# Altium footprint library Selex_PCBLib.PcbLib: 388 footprints (part 10 of 25)
Each footprint in its own frame and in the unit in brackets; x right, y up, seen from the top. Pads: shape width x height; smd on the part's side, far side on the other; paste and mask are expansions set on the pad; w line width, h text height; cw(c..) or ccw(c..) is an arc to the next point about the centre after c.
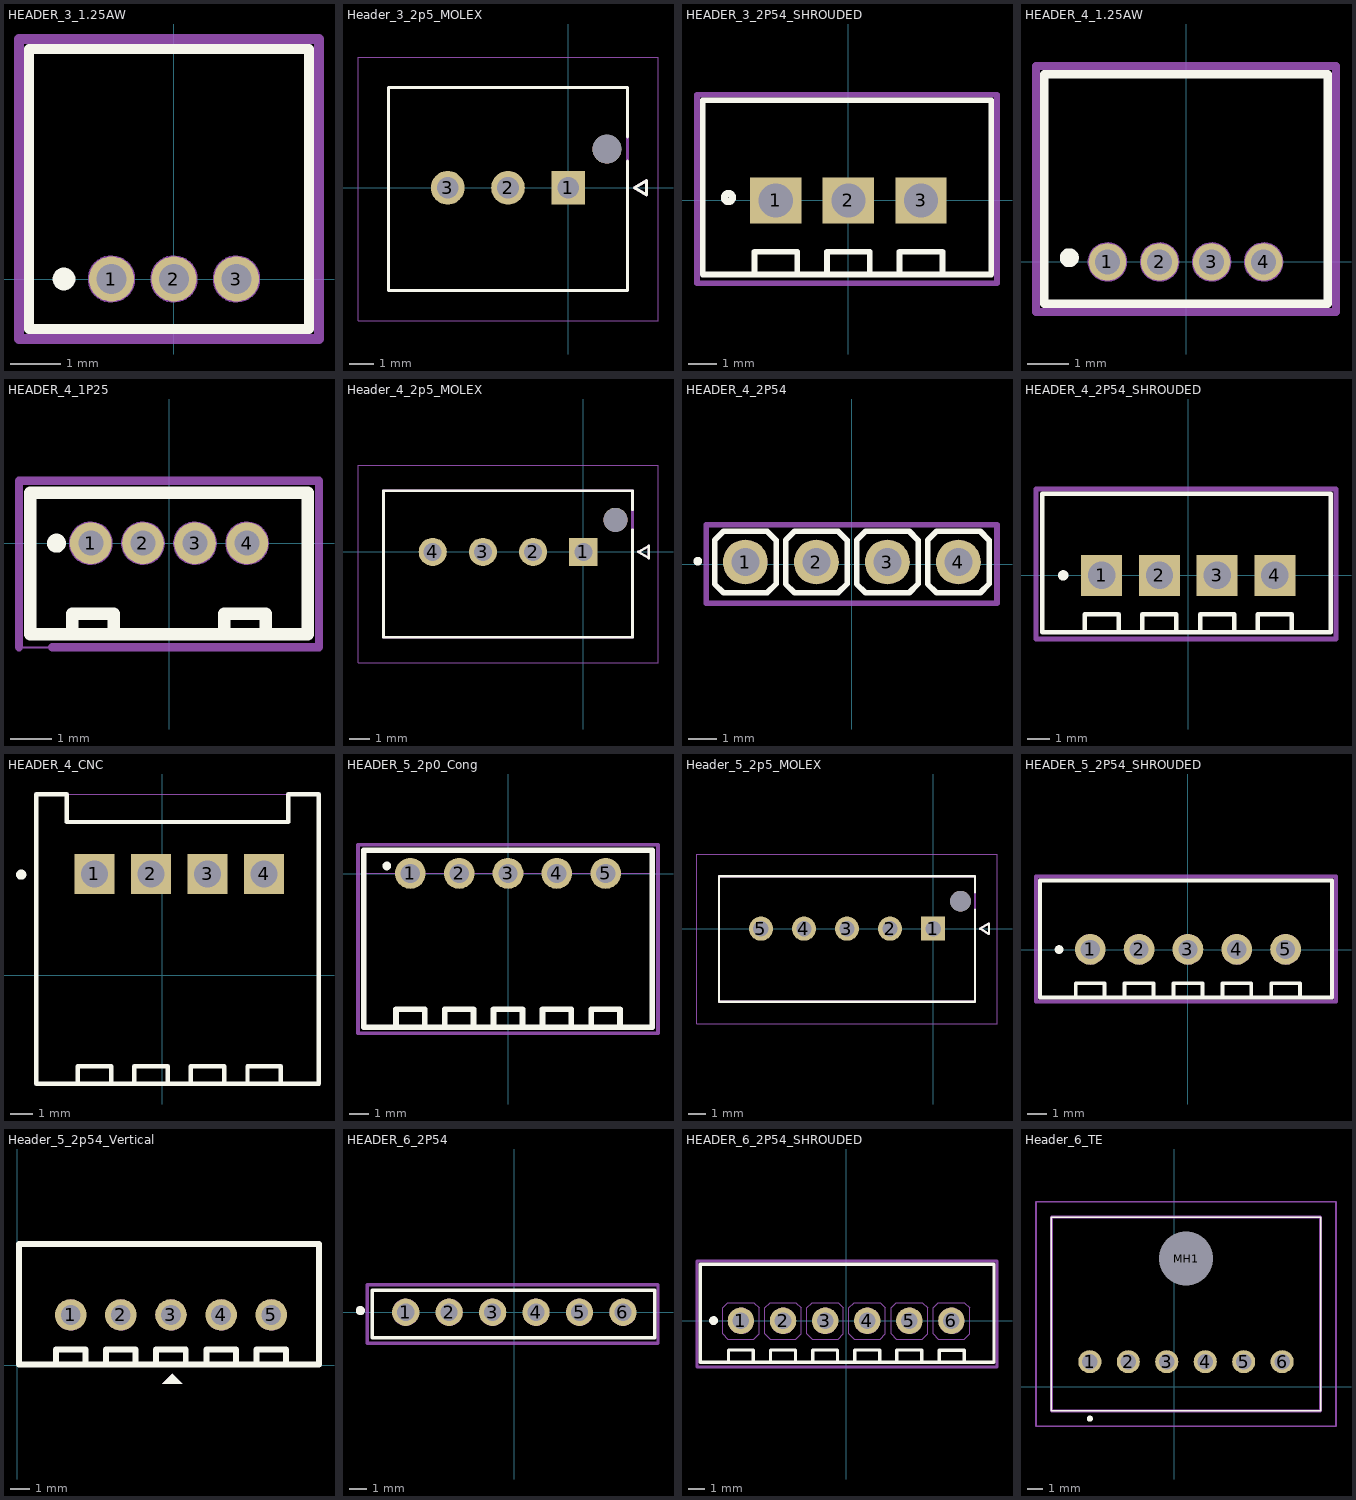
[diagram p9: the footprints below, top view; thin cyan lines are the x and y axes]

## HEADER_3_1.25AW [mm]
pads (3):
  round 0.9 hole 0.6 mask+0.05: 1(-1.25,0) 2(0,0) 3(1.25,0)
Top Overlay:
  circle w0.254: c-2.2,0 r0.1
  lines w0.2: -2.9,-1 -2.9,4.6 2.7,4.6 2.7,-1 -2.9,-1
Mechanical 1:
  circle w0.05: c-1.25,0 r0.45
  circle w0.05: c0,0 r0.45
  circle w0.05: c1.25,0 r0.45
  lines w0.05: -2.85,-1 2.7,-1 2.7,4.6 -2.85,4.6 -2.85,-1
Mechanical 15:
  lines w0.2: -3.1,-1.2 -3.1,4.8 2.9,4.8 2.9,-1.2 -3.1,-1.2
3D body "47566.stp": height 3.68, standoff -2.22, extent -2.8,-0.9 2.6,4.5

## Header_3_2p5_MOLEX [mm]
pads (4):
  rect 1.4x1.4 hole 0.9 mask+0.076: 1(0,0)
  round 1.4 hole 0.9 mask+0.076: 2(-2.5,0) 3(-5,0)
  round 1.2 hole 1.2 unplated mask+0.076: ""(1.6,1.6)
Top Overlay:
  lines w0.127: 2.45,1.1 2.45,-4.25 -7.45,-4.25 -7.45,4.15 2.45,4.15 2.45,2.1 ; 2.75,0 3.25,-0.3 3.25,0.3 2.75,0
Bottom Solder:
  circle w0.776: c-2.5,0 r0.388
  circle w0.676: c1.6,1.6 r0.338
  circle w0.776: c-5,0 r0.388
  region: 0.776,-0.776 -0.776,-0.776 -0.776,0.776 0.776,0.776
Mechanical 13:
  lines w0.127: -7.45,-4.25 2.45,-4.25 2.45,4.15 -7.45,4.15 -7.45,-4.25 ; 2.75,0 3.25,-0.3 3.25,0.3 2.75,0
Mechanical 15:
  lines w0.05: -8.72,-5.52 3.72,-5.52 3.72,5.42 -8.72,5.42 -8.72,-5.52
3D body "2078430003--3DModel-STEP-361473.STEP": height 9, standoff -3, extent -7.45,-4.2 2.47,4.2

## HEADER_3_2P54_SHROUDED [mm] "HEADER_3_2P0"
pads (3):
  rect 1.8x1.6 hole 1.2 mask+0.1: 1(-2.54,0) 2(0,0) 3(2.54,0)
Top Overlay:
  circle w0.254: c-4.2,0.1 r0.141
  lines w0.2: -3.29,-2.5 -3.29,-1.8 -1.79,-1.8 -1.79,-2.5 ; -0.75,-2.5 -0.75,-1.8 0.75,-1.8 0.75,-2.5 ; 1.79,-2.5 1.79,-1.8 3.29,-1.8 3.29,-2.5 ; -5.1,-2.596 5,-2.596 5,3.504 -5.1,3.504 -5.1,-2.596
Mechanical 1:
  circle w0.05: c2.54,0 r0.762
  circle w0.05: c0,0 r0.762
  circle w0.05: c-2.54,0 r0.762
  lines w0.05: -3.29,-2.596 -3.29,-1.8 -1.79,-1.8 -1.79,-2.596 ; -0.75,-2.596 -0.75,-1.8 0.75,-1.8 0.75,-2.596 ; 1.79,-2.59 1.79,-1.8 3.29,-1.8 3.29,-2.596 ; -5.18,-2.596 -5.18,3.504 5.1,3.504 5.1,-2.596 -5.18,-2.596
  text "1" at -2.7,-0.4 h0.8
  text "2" at -0.3,-0.4 h0.8
  text "3" at 2.3,-0.4 h0.8
Mechanical 15:
  lines w0.2: -5.3,-2.9 -5.3,3.7 5.2,3.7 5.2,-2.9 2.4,-2.9 -5.3,-2.9
3D body "JST3.step": height 7, standoff -3.4, extent -4.99,-2.375 4.91,3.375

## HEADER_4_1.25AW [mm]
pads (4):
  round 0.9 hole 0.6 mask+0.05: 1(-1.885,0) 2(-0.635,0) 3(0.615,0) 4(1.865,0)
Top Overlay:
  circle w0.254: c-2.8,0.1 r0.1
  lines w0.2: -3.4,-1 3.4,-1 3.4,4.5 -3.4,4.5 -3.4,-1
Mechanical 1:
  circle w0.05: c0.615,0 r0.45
  circle w0.05: c-0.635,0 r0.45
  circle w0.05: c-1.885,0 r0.45
  circle w0.05: c1.865,0 r0.45
  lines w0.05: -3.4,-1 3.4,-1 3.4,4.5 -3.4,4.5 -3.4,-1
Mechanical 15:
  lines w0.2: -3.6,-1.2 -3.6,4.7 3.6,4.7 3.6,-1.2 -3.6,-1.2
3D body "31731.stp": height 3.68, standoff -2.22, extent -3.31,-1 3.34,4.4

## HEADER_4_1P25 [mm]
pads (4):
  round 1 hole 0.6 mask+0.05: 1(-1.875,0) 2(-0.625,0) 3(0.625,0) 4(1.875,0)
Top Overlay:
  circle w0.254: c-2.7,0 r0.1
  lines w0.3: -2.325,-2.19 -2.325,-1.69 -1.325,-1.69 -1.325,-2.19 ; 1.325,-2.19 1.325,-1.69 2.325,-1.69 2.325,-2.19 ; -3.325,-2.19 3.325,-2.19 3.325,1.21 -3.325,1.21 -3.325,-2.19
Mechanical 1:
  circle w0.05: c-1.875,0 r0.5
  circle w0.05: c-0.625,0 r0.5
  circle w0.05: c0.625,0 r0.5
  circle w0.05: c1.875,0 r0.5
  lines w0.05: -3.325,-2.19 3.325,-2.19 3.325,1.21 -3.325,1.21 -3.325,-2.19
Mechanical 15:
  lines w0.05: -3.6,-2.5 -2.8,-2.5
  lines w0.2: -3.6,-2.5 -3.6,1.5 3.6,1.5 3.6,-2.5 -2.8,-2.5
3D body "K180011057_Stig-Wahlstrom.step": height 4.3, standoff -2.3, extent -3.325,-2.32 3.325,1.08

## Header_4_2p5_MOLEX [mm]
pads (5):
  rect 1.4x1.4 hole 0.9 mask+0.076: 1(0,0)
  round 1.4 hole 0.9 mask+0.076: 2(-2.5,0) 3(-5,0) 4(-7.5,0)
  round 1.2 hole 1.2 unplated mask+0.076: ""(1.6,1.6)
Top Overlay:
  lines w0.127: 2.45,1.1 2.45,-4.25 -9.95,-4.25 -9.95,3.05 2.45,3.05 2.45,2.1 ; 2.75,0 3.25,0.3 3.25,-0.3 2.75,0
Bottom Solder:
  circle w0.776: c-7.5,0 r0.388
  circle w0.776: c-5,0 r0.388
  circle w0.676: c1.6,1.6 r0.338
  circle w0.776: c-2.5,0 r0.388
  region: 0.776,-0.776 -0.776,-0.776 -0.776,0.776 0.776,0.776
Mechanical 13:
  lines w0.127: -9.95,-4.25 -9.95,3.05 2.45,3.05 2.45,-4.25 -9.95,-4.25 ; 2.75,0 3.25,0.3 3.25,-0.3 2.75,0
Mechanical 15:
  lines w0.05: -11.22,-5.52 -11.22,4.32 3.72,4.32 3.72,-5.52 -11.22,-5.52
3D body "2078430004--3DModel-STEP-361473.STEP": height 9, standoff -3, extent -9.905,-4.25 2.505,3.05

## HEADER_4_2P54 [mm]
pads (4):
  round 1.6 hole 1 mask+0.1: 1(-3.8,0.07) 2(-1.26,0.07) 3(1.28,0.07) 4(3.82,0.07)
Top Overlay:
  circle w0.254: c-5.5,0.1 r0.03
  lines w0.2: -4.9,-0.71 -4.9,0.85 -4.58,1.17 -3.02,1.17 -2.7,0.85 -2.7,-0.71 -3.02,-1.03 -4.58,-1.03 -4.9,-0.71 ; -2.36,-0.71 -2.36,0.85 -2.04,1.17 -0.48,1.17 -0.16,0.85 -0.16,-0.71 -0.48,-1.03 -2.04,-1.03 -2.36,-0.71 ; 0.18,-0.71 0.18,0.85 0.5,1.17 2.06,1.17 2.38,0.85 2.38,-0.71 2.06,-1.03 0.5,-1.03 0.18,-0.71 ; 2.72,-0.71 2.72,0.85 3.04,1.17 4.6,1.17 4.92,0.85 4.92,-0.71 4.6,-1.03 3.04,-1.03 2.72,-0.71
Mechanical 1:
  circle w0.05: c-3.8,0.07 r0.762
  circle w0.05: c-1.26,0.07 r0.762
  circle w0.05: c1.28,0.07 r0.762
  circle w0.05: c3.82,0.07 r0.762
  lines w0.05: -4.9,-0.71 -4.58,-1.03 -3.02,-1.03 -2.7,-0.71 -2.7,0.85 -3.02,1.17 -4.58,1.17 -4.9,0.85 -4.9,-0.71 ; -2.36,-0.71 -2.04,-1.03 -0.48,-1.03 -0.16,-0.71 -0.16,0.85 -0.48,1.17 -2.04,1.17 -2.36,0.85 -2.36,-0.71 ; 0.18,-0.71 0.5,-1.03 2.06,-1.03 2.38,-0.71 2.38,0.85 2.06,1.17 0.5,1.17 0.18,0.85 0.18,-0.71 ; 2.72,-0.71 3.04,-1.03 4.6,-1.03 4.92,-0.71 4.92,0.85 4.6,1.17 3.04,1.17 2.72,0.85 2.72,-0.71
  text "1" at -3.97,-0.29 h0.8
  text "2" at -1.57,-0.29 h0.8
  text "3" at 1.03,-0.29 h0.8
  text "4" at 3.53,-0.29 h0.8
Mechanical 15:
  lines w0.2: -5.2,-1.4 -5.2,1.4 5.2,1.4 5.2,-1.4 -5.2,-1.4
3D body "HEADER1.step": height 5.94, standoff -2.94, extent -0.02,-1.23 2.52,1.31
3D body "HEADER1.step": height 5.94, standoff -2.94, extent 2.52,-1.23 5.06,1.31
3D body "HEADER1.step": height 5.94, standoff -2.94, extent -2.56,-1.23 -0.02,1.31
3D body "HEADER1.step": height 5.94, standoff -2.94, extent -5.1,-1.23 -2.56,1.31

## HEADER_4_2P54_SHROUDED [mm]
pads (4):
  rect 1.8x1.8 hole 1.2 mask+0.1: 1(-3.81,0) 2(-1.27,0) 3(1.27,0) 4(3.81,0)
Top Overlay:
  circle w0.254: c-5.5,0 r0.1
  lines w0.2: -4.56,-2.47 -4.56,-1.72 ; -4.56,-1.714 -3.06,-1.714 ; -3.06,-2.47 -3.06,-1.72 ; -2.02,-2.47 -2.02,-1.72 ; -2.02,-1.714 -0.52,-1.714 ; -0.52,-2.47 -0.52,-1.72 ; 0.52,-2.47 0.52,-1.72 ; 0.52,-1.714 2.02,-1.714 ; 2.02,-2.47 2.02,-1.72 ; 3.06,-2.47 3.06,-1.72 ; 3.06,-1.714 4.56,-1.714 ; 4.56,-2.47 4.56,-1.72 ; -6.43,-2.51 -6.43,3.586 6.27,3.586 6.27,-2.51 -6.43,-2.51
Mechanical 1:
  circle w0.05: c-3.81,0 r0.762
  circle w0.05: c-1.27,0 r0.762
  circle w0.05: c1.27,0 r0.762
  circle w0.05: c3.81,0 r0.762
  lines w0.05: -4.54,-2.49 -4.54,-1.714 -3.04,-1.714 -3.04,-2.5 ; -2,-2.51 -2,-1.714 -0.5,-1.714 -0.5,-2.5 ; 0.54,-2.51 0.54,-1.714 2.04,-1.714 2.04,-2.51 ; 3.08,-2.51 3.08,-1.714 4.58,-1.714 4.58,-2.51 ; -6.43,-2.51 6.27,-2.51 6.27,3.586 -6.43,3.586 -6.43,-2.51
  text "4" at 3.49,-0.4 h0.8
  text "3" at 0.99,-0.4 h0.8
  text "2" at -1.61,-0.4 h0.8
  text "1" at -4.01,-0.4 h0.8
Mechanical 15:
  lines w0.2: -6.7,-2.8 6.5,-2.8 6.5,3.8 -6.7,3.8 -6.7,-2.8
3D body "JST4.step": height 7, standoff -3.4, extent -6.28,-2.335 6.12,3.415

## HEADER_4_CNC [mm]
pads (4):
  rect 1.8x1.8 hole 1.2 mask+0.1: 1(-3.055,4.548) 2(-0.515,4.548) 3(2.025,4.548) 4(4.565,4.548)
Top Overlay:
  circle w0.254: c-6.342,4.514 r0.1
  lines w0.2: -5.675,-4.881 -5.675,8.134 -4.294,8.134 -4.294,6.879 5.641,6.879 5.641,8.134 5.644,8.134 7.025,8.134 7.025,-4.885 ; -5.67,-4.881 7.03,-4.881 ; -3.8,-4.841 -3.8,-4.091 ; -3.8,-4.085 -2.3,-4.085 ; -2.3,-4.841 -2.3,-4.091 ; -1.26,-4.841 -1.26,-4.091 ; -1.26,-4.085 0.24,-4.085 ; 0.24,-4.841 0.24,-4.091 ; 1.28,-4.841 1.28,-4.091 ; 1.28,-4.085 2.78,-4.085 ; 2.78,-4.841 2.78,-4.091 ; 3.82,-4.841 3.82,-4.091 ; 3.82,-4.085 5.32,-4.085 ; 5.32,-4.841 5.32,-4.091
Mechanical 1:
  circle w0.05: c-3.055,4.548 r0.762
  circle w0.05: c-0.515,4.548 r0.762
  circle w0.05: c2.025,4.548 r0.762
  circle w0.05: c4.565,4.548 r0.762
  lines w0.05: -5.675,2.038 -5.675,8.134 7.025,8.134 7.025,2.038 ; -5.67,-4.881 7.03,-4.881 ; -3.78,-4.861 -3.78,-4.085 -2.28,-4.085 -2.28,-4.871 ; -1.24,-4.881 -1.24,-4.085 0.26,-4.085 0.26,-4.871 ; 1.3,-4.881 1.3,-4.085 2.8,-4.085 2.8,-4.881 ; 3.84,-4.881 3.84,-4.085 5.34,-4.085 5.34,-4.881
  text "4" at 4.245,4.148 h0.8
  text "3" at 1.745,4.148 h0.8
  text "2" at -0.855,4.148 h0.8
  text "1" at -3.255,4.148 h0.8

## HEADER_5_2p0_Cong [mm]
pads (5):
  round 1.6 hole 1 mask+0.1: 1(-5.08,0.01) 2(-2.54,0.01) 3(0,0.01) 4(2.54,0.01) 5(5.08,0.01)
Top Overlay:
  circle w0.254: c-6.3,0.4 r0.1
  lines w0.3: -5.83,-7.8 -5.83,-7.05 -4.33,-7.05 -4.33,-7.8 ; -3.29,-7.8 -3.29,-7.05 -1.79,-7.05 -1.79,-7.8 ; -0.75,-7.8 -0.75,-7.05 0.75,-7.05 0.75,-7.8 ; 1.79,-7.8 1.79,-7.05 3.29,-7.05 3.29,-7.8 ; 4.33,-7.8 4.33,-7.05 5.83,-7.05 5.83,-7.8 ; -7.5,-7.99 -7.5,1.21 7.5,1.21 7.5,-7.99 -7.5,-7.99
Mechanical 1:
  lines w0.05: -7.5,-7.99 -7.5,0.01 7.5,0.01 7.5,-7.99 -7.5,-7.99
Mechanical 15:
  lines w0.2: -7.8,-8.3 7.8,-8.3 7.8,1.5 -7.8,1.5 -7.8,-8.3
3D body "User Library-XH_5P_2_54W_SHELL.step": height 6, standoff 0.2, extent -7.5,-7.59 7.4,-0.59

## Header_5_2p5_MOLEX [mm]
pads (6):
  rect 1.4x1.4 hole 0.9 mask+0.076: 1(0,0)
  round 1.4 hole 0.9 mask+0.076: 2(-2.5,0) 3(-5,0) 4(-7.5,0) 5(-10,0)
  round 1.2 hole 1.2 unplated mask+0.076: ""(1.6,1.6)
Top Overlay:
  lines w0.127: 2.45,1.1 2.45,-4.25 -12.45,-4.25 -12.45,3.05 2.45,3.05 2.45,2.1 ; 2.75,0 3.25,-0.3 3.25,0.3 2.75,0
Bottom Solder:
  circle w0.776: c-2.5,0 r0.388
  circle w0.676: c1.6,1.6 r0.338
  circle w0.776: c-5,0 r0.388
  circle w0.776: c-7.5,0 r0.388
  circle w0.776: c-10,0 r0.388
  region: 0.776,-0.776 -0.776,-0.776 -0.776,0.776 0.776,0.776
Mechanical 13:
  lines w0.127: -12.45,-4.25 2.45,-4.25 2.45,3.05 -12.45,3.05 -12.45,-4.25 ; 2.75,0 3.25,-0.3 3.25,0.3 2.75,0
Mechanical 15:
  lines w0.05: -13.72,-5.52 3.72,-5.52 3.72,4.32 -13.72,4.32 -13.72,-5.52
3D body "2078430005.stp": height 9, standoff -3, extent -12.455,-4.25 2.455,3.05

## HEADER_5_2P54_SHROUDED [mm]
pads (5):
  round 1.6 hole 1 mask+0.1: 1(-5.08,0.01) 2(-2.54,0.01) 3(0,0.01) 4(2.54,0.01) 5(5.08,0.01)
Top Overlay:
  circle w0.254: c-6.7,0 r0.1
  lines w0.2: -5.83,-2.5 -5.83,-1.75 -4.33,-1.75 -4.33,-2.5 ; -3.29,-2.5 -3.29,-1.75 -1.79,-1.75 -1.79,-2.5 ; -0.75,-2.5 -0.75,-1.75 0.75,-1.75 0.75,-2.5 ; 1.79,-2.5 1.79,-1.75 3.29,-1.75 3.29,-2.5 ; 4.33,-2.5 4.33,-1.75 5.83,-1.75 5.83,-2.5 ; -7.7,-2.5 -7.7,3.596 7.5,3.596 7.5,-2.5 -7.7,-2.5
Mechanical 1:
  circle w0.05: c-5.08,0.01 r0.762
  circle w0.05: c-2.54,0.01 r0.762
  circle w0.05: c0,0.01 r0.762
  circle w0.05: c2.54,0.01 r0.762
  circle w0.05: c5.08,0.01 r0.762
  lines w0.05: -5.83,-2.5 -5.83,-1.75 -4.33,-1.75 -4.33,-2.5 ; -3.29,-2.5 -3.29,-1.75 -1.79,-1.75 -1.79,-2.5 ; -0.75,-2.5 -0.75,-1.75 0.75,-1.75 0.75,-2.5 ; 1.79,-2.5 1.79,-1.75 3.29,-1.75 3.29,-2.5 ; 4.33,-2.5 4.33,-1.75 5.83,-1.75 5.83,-2.5 ; -7.7,-2.5 7.5,-2.5 7.5,3.596 -7.7,3.596 -7.7,-2.5
  text "5" at 4.9,-0.39 h0.8
  text "1" at -5.18,-0.39 h0.8
  text "2" at -2.78,-0.39 h0.8
  text "3" at -0.3,-0.39 h0.8
  text "4" at 2.2,-0.39 h0.8
Mechanical 15:
  lines w0.2: -7.9,-2.7 7.7,-2.7 7.7,3.8 -7.9,3.8 -7.9,-2.7
3D body "JST5.step": height 7, standoff -3.4, extent -7.53,-2.34 7.37,3.41

## Header_5_2p54_Vertical [mm]
pads (5):
  round 1.6 hole 1 mask+0.1: 1(2.71,2.56) 2(5.25,2.56) 3(7.79,2.56) 4(10.33,2.56) 5(12.87,2.56)
Top Overlay:
  region: 7.35,-0.93 7.85,-0.43 8.35,-0.93
  lines w0.3: 1.96,0.05 1.96,0.8 3.46,0.8 3.46,0.05 ; 4.5,0.05 4.5,0.8 6,0.8 6,0.05 ; 7.04,0.05 7.04,0.8 8.54,0.8 8.54,0.05 ; 9.58,0.05 9.58,0.8 11.08,0.8 11.08,0.05 ; 12.12,0.05 12.12,0.8 13.62,0.8 13.62,0.05 ; 0.09,0.05 0.09,6.146 15.29,6.146 15.29,0.05 0.09,0.05
Mechanical 1:
  circle w0.05: c2.71,2.56 r0.762
  circle w0.05: c5.25,2.56 r0.762
  circle w0.05: c7.79,2.56 r0.762
  circle w0.05: c10.33,2.56 r0.762
  circle w0.05: c12.87,2.56 r0.762
  region: 7.35,-0.93 7.85,-0.43 8.35,-0.93
  lines w0.05: 1.96,0.05 1.96,0.8 3.46,0.8 3.46,0.05 ; 4.5,0.05 4.5,0.8 6,0.8 6,0.05 ; 7.04,0.05 7.04,0.8 8.54,0.8 8.54,0.05 ; 9.58,0.05 9.58,0.8 11.08,0.8 11.08,0.05 ; 12.12,0.05 12.12,0.8 13.62,0.8 13.62,0.05 ; 0.09,0.05 15.29,0.05 15.29,6.146 0.09,6.146 0.09,0.05
  text "5" at 12.69,2.16 h0.8
  text "1" at 2.61,2.16 h0.8
  text "2" at 5.01,2.16 h0.8
  text "3" at 7.49,2.16 h0.8
  text "4" at 9.99,2.16 h0.8
3D body "JST5.step": height 7, standoff -3.4, extent 0.26,0.21 15.16,5.96

## HEADER_6_2P54 [mm]
pads (6):
  round 1.6 hole 1 mask+0.1: 1(-6.35,0) 2(-3.81,0) 3(-1.27,0) 4(1.27,0) 5(3.81,0) 6(6.35,0)
Top Overlay:
  circle w0.254: c-9,0.1 r0.141
  lines w0.2: -8.3,-1.5 -8.3,1.3 8.2,1.3 8.2,-1.5 -8.3,-1.5
Mechanical 1:
  circle w0.05: c-6.35,0 r0.762
  circle w0.05: c-3.81,0 r0.762
  circle w0.05: c-1.27,0 r0.762
  circle w0.05: c1.27,0 r0.762
  circle w0.05: c3.81,0 r0.762
  circle w0.05: c6.35,0 r0.762
  text "5" at 3.57,-0.37 h0.8
  text "1" at -6.51,-0.37 h0.8
  text "2" at -4.11,-0.37 h0.8
  text "3" at -1.53,-0.37 h0.8
  text "4" at 0.97,-0.37 h0.8
  text "6" at 6.04,-0.42 h0.8
Mechanical 15:
  lines w0.2: -8.6,-1.8 -8.6,1.6 -5.5,1.6 8.4,1.6 8.4,-1.8 -8.6,-1.8
3D body "HEADER6PFEM.stp": height 8.3, standoff -3.2, extent -8.05,-1.3 8.05,1.1

## HEADER_6_2P54_SHROUDED [mm]
pads (6):
  round 1.6 hole 1 mask+0.1: 1(-6.35,-0.01) 2(-3.81,-0.01) 3(-1.27,-0.01) 4(1.27,-0.01) 5(3.81,-0.01) 6(6.35,-0.01)
Top Overlay:
  circle w0.254: c-8,0 r0.141
  lines w0.2: -7.1,-2.52 -7.1,-1.77 -5.6,-1.77 -5.6,-2.52 ; -4.56,-2.52 -4.56,-1.77 -3.06,-1.77 -3.06,-2.52 ; -2.02,-2.52 -2.02,-1.77 -0.52,-1.77 -0.52,-2.52 ; 0.52,-2.52 0.52,-1.77 2.02,-1.77 2.02,-2.52 ; 3.06,-2.52 3.06,-1.77 4.56,-1.77 4.56,-2.52 ; 5.62,-2.43 5.62,-1.78 7.12,-1.78 7.12,-2.38 ; -8.8,-2.52 -8.8,3.4 8.92,3.4 8.92,-2.52 -8.8,-2.52
Mechanical 1:
  circle w0.05: c6.35,-0.01 r0.762
  circle w0.05: c3.81,-0.01 r0.762
  circle w0.05: c1.27,-0.01 r0.762
  circle w0.05: c-1.27,-0.01 r0.762
  circle w0.05: c-3.81,-0.01 r0.762
  circle w0.05: c-6.35,-0.01 r0.762
  lines w0.05: -7.45,-0.79 -7.13,-1.11 -5.57,-1.11 -5.25,-0.79 -5.25,0.77 -5.57,1.09 -7.13,1.09 -7.45,0.77 -7.45,-0.79 ; -4.91,-0.79 -4.59,-1.11 -3.03,-1.11 -2.71,-0.79 -2.71,0.77 -3.03,1.09 -4.59,1.09 -4.91,0.77 -4.91,-0.79 ; -2.37,-0.79 -2.05,-1.11 -0.49,-1.11 -0.17,-0.79 -0.17,0.77 -0.49,1.09 -2.05,1.09 -2.37,0.77 -2.37,-0.79 ; 0.17,-0.79 0.49,-1.11 2.05,-1.11 2.37,-0.79 2.37,0.77 2.05,1.09 0.49,1.09 0.17,0.77 0.17,-0.79 ; 2.71,-0.79 3.03,-1.11 4.59,-1.11 4.91,-0.79 4.91,0.77 4.59,1.09 3.03,1.09 2.71,0.77 2.71,-0.79 ; 5.25,-0.79 5.57,-1.11 7.13,-1.11 7.45,-0.79 7.45,0.77 7.13,1.09 5.57,1.09 5.25,0.77 5.25,-0.79
  text "6" at 6.04,-0.43 h0.8
  text "4" at 0.97,-0.38 h0.8
  text "3" at -1.53,-0.38 h0.8
  text "2" at -4.11,-0.38 h0.8
  text "1" at -6.51,-0.38 h0.8
  text "5" at 3.57,-0.38 h0.8
Mechanical 15:
  lines w0.2: -9,-2.8 -9,3.6 9.1,3.6 9.1,-2.8 -9,-2.8
3D body "JST6.step": height 7, standoff -3.4, extent -8.68,-2.43 8.72,3.32

## Header_6_TE [mm]
pads (7):
  round 1.5 hole 1: 1(-5.48,1.613) 2(-2.98,1.613) 3(-0.48,1.613) 4(2.02,1.613) 5(4.52,1.613) 6(7.02,1.613)
  round 1.755 hole 3.511 unplated: MH1(0.77,8.313)
Top Overlay:
  lines w0.1: -7.98,-1.587 -7.98,11.013 9.52,11.013 9.52,-1.587 -7.98,-1.587
  lines w0.2: -5.48,-2.187 ccw(c-5.48,-2.087) -5.48,-1.987 ccw(c-5.48,-2.087) -5.48,-2.187
Mechanical 13:
  lines w0.2: -7.98,-1.587 -7.98,11.013 9.52,11.013 9.52,-1.587 -7.98,-1.587
Mechanical 15:
  lines w0.1: -8.98,-2.587 -8.98,12.013 10.52,12.013 10.52,-2.587 -8.98,-2.587
3D body "1744446-6.stp": height 7.51, standoff -3.59, extent -7.98,-1.757 9.52,10.843